# Altium footprint library PcbLib.PcbLib: 428 footprints (part 14 of 27)
Each footprint in its own frame and in the unit in brackets; x right, y up, seen from the top. Pads: shape width x height; smd on the part's side, far side on the other; paste and mask are expansions set on the pad; w line width, h text height; cw(c..) or ccw(c..) is an arc to the next point about the centre after c.
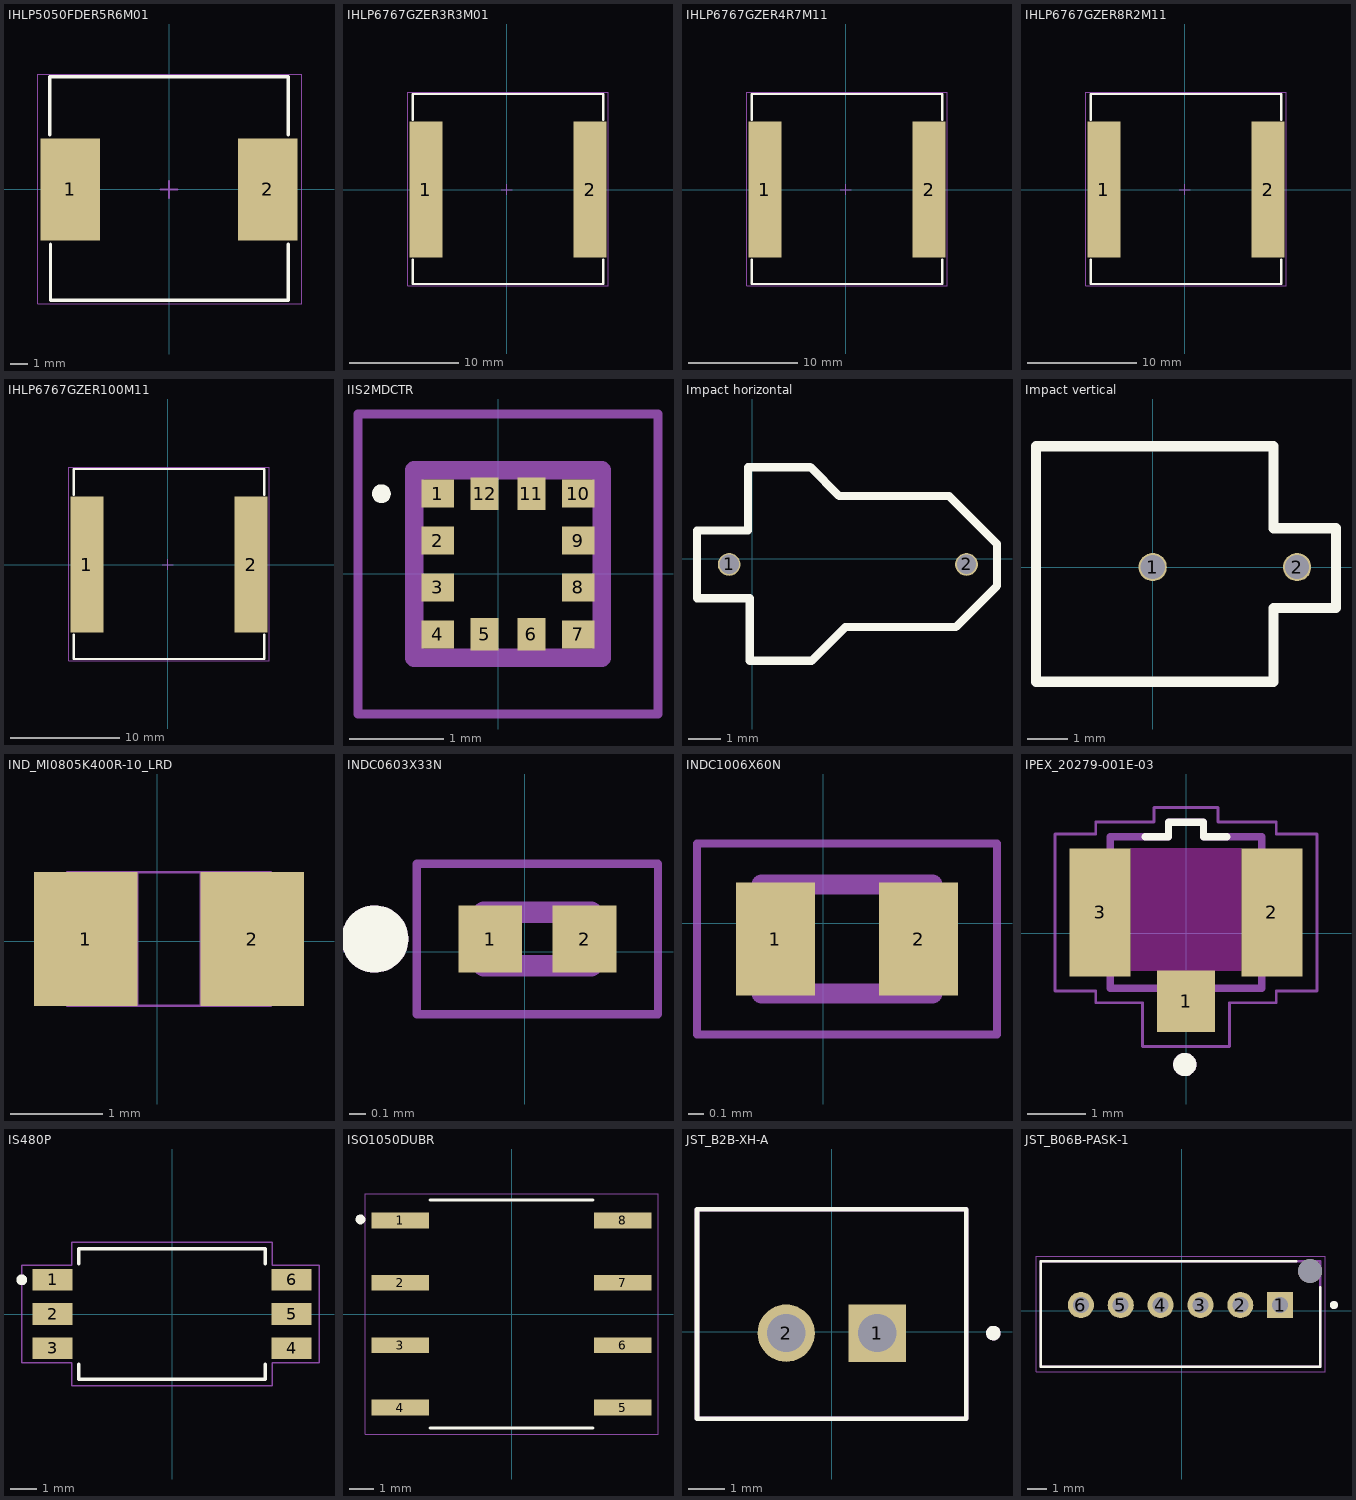
[diagram p13: the footprints below, top view; thin cyan lines are the x and y axes]

## IHLP5050FDER5R6M01 [mm] "Precision Wire Wound Inductor, 2-Leads, Body 10.80x10.16mm, IPC Medium Density"
height 4
pads (2):
  rect 3.5x6 smd: 1(-5.8,0) 2(5.8,0)
Top Overlay:
  lines w0.2: -7,3.2 -7,6.6 7,6.6 7,3.2 ; -6.95,-3.2 -6.95,-6.5 7,-6.5 7,-3.2
Mechanical 15:
  lines w0.05: -7.7,-6.7 -7.7,6.75 7.8,6.75 7.8,-6.7 -7.7,-6.7
  lines w0.1: -0.5,0 0.5,0 ; 0,-0.5 0,0.5
3D body "IND_IHLP_5050_FD_VIS.step": height 6.55, standoff 0, extent -6.858,-6.402 6.858,6.502

## IHLP6767GZER3R3M01 [mm] "Precision Wire Wound Inductor, 2-Leads, Body 10.80x10.16mm, IPC Medium Density"
height 4
pads (2):
  rect 3x12.45 smd: 1(-7.4,0) 2(7.65,0)
Top Overlay:
  lines w0.2: -8.6,-6.4 -8.6,-8.65 8.85,-8.65 8.85,-6.4 ; -8.6,6.4 -8.6,8.75 8.85,8.75 8.85,6.4
Mechanical 15:
  lines w0.05: -9.05,-8.8 -9.05,8.9 9.3,8.9 9.3,-8.8 -9.05,-8.8
  lines w0.1: -0.5,0 0.5,0 ; 0,-0.5 0,0.5
3D body "IHLP6767GZ.step": height 7.29, standoff 0.4, extent -8.456,-8.532 8.72,8.643

## IHLP6767GZER4R7M11 [mm] "Precision Wire Wound Inductor, 2-Leads, Body 10.80x10.16mm, IPC Medium Density"
height 4
pads (2):
  rect 3x12.45 smd: 1(-7.4,0) 2(7.65,0)
Top Overlay:
  lines w0.2: -8.6,-6.4 -8.6,-8.65 8.85,-8.65 8.85,-6.4 ; -8.6,6.4 -8.6,8.75 8.85,8.75 8.85,6.4
Mechanical 15:
  lines w0.05: -9.05,-8.8 -9.05,8.9 9.3,8.9 9.3,-8.8 -9.05,-8.8
  lines w0.1: -0.5,0 0.5,0 ; 0,-0.5 0,0.5
3D body "IHLP6767GZ.step": height 7.09, standoff 0.2, extent -8.454,-8.562 8.721,8.614

## IHLP6767GZER8R2M11 [mm] "Precision Wire Wound Inductor, 2-Leads, Body 10.80x10.16mm, IPC Medium Density"
height 4
pads (2):
  rect 3x12.45 smd: 1(-7.4,0) 2(7.65,0)
Top Overlay:
  lines w0.2: -8.6,-6.4 -8.6,-8.65 8.85,-8.65 8.85,-6.4 ; -8.6,6.4 -8.6,8.75 8.85,8.75 8.85,6.4
Mechanical 15:
  lines w0.05: -9.05,-8.8 -9.05,8.9 9.3,8.9 9.3,-8.8 -9.05,-8.8
  lines w0.1: -0.5,0 0.5,0 ; 0,-0.5 0,0.5
3D body "IHLP6767GZ.step": height 7.09, standoff 0.2, extent -8.45,-8.538 8.725,8.638

## IHLP6767GZER100M11 [mm] "Precision Wire Wound Inductor, 2-Leads, Body 10.80x10.16mm, IPC Medium Density"
height 4
pads (2):
  rect 3x12.45 smd: 1(-7.4,0) 2(7.65,0)
Top Overlay:
  lines w0.2: -8.6,-6.4 -8.6,-8.65 8.85,-8.65 8.85,-6.4 ; -8.6,6.4 -8.6,8.75 8.85,8.75 8.85,6.4
Mechanical 15:
  lines w0.05: -9.05,-8.8 9.3,-8.8 9.3,8.9 -9.05,8.9 -9.05,-8.8
  lines w0.1: -0.5,0 0.5,0 ; 0,-0.5 0,0.5
3D body "IHLP6767GZ.step": height 6.99, standoff 0.1, extent -8.471,-8.564 8.704,8.612

## IIS2MDCTR [mm]
pads (12):
  rect 0.35x0.3 smd: 1(-0.648,0.852) 2(-0.648,0.352) 3(-0.648,-0.148) 4(-0.648,-0.648) 7(0.852,-0.648) 8(0.852,-0.148) 9(0.852,0.352) 10(0.852,0.852)
  rect 0.3x0.35 smd: 5(-0.148,-0.648) 6(0.352,-0.648) 11(0.352,0.852) 12(-0.148,0.852)
Top Overlay:
  lines w0.1: -1.298,0.852 ccw(c-1.248,0.852) -1.198,0.852 ccw(c-1.248,0.852) -1.298,0.852
Mechanical 13:
  lines w0.1: -1.498,-1.498 -1.498,1.702 1.702,1.702 1.702,-1.498 -1.498,-1.498
  lines w0.2: -0.898,-0.898 -0.898,1.102 1.102,1.102 1.102,-0.898 -0.898,-0.898
3D body "step_temp.STEP": height 0.7, standoff 0, extent -0.898,-0.898 1.102,1.102

## Impact horizontal [mm]
pads (2):
  round 0.7 / inner round 1.524 / far side round 1.524 hole 0.6: 1(-0.711,-0.178) 2(6.604,-0.178)
Top Overlay:
  lines w0.254: -1.702,-1.219 -1.702,0.864 -0.127,0.864 -0.127,2.819 1.791,2.819 2.68,1.93 4.737,1.93 6.071,1.93 7.544,0.457 7.544,-0.838 6.274,-2.108 4.597,-2.108 2.87,-2.108 1.829,-3.15 -0.076,-3.15 -0.076,-1.219 -1.702,-1.219
3D body: height 4.8, standoff 1.2, extent 2.289,-1.88 5.889,1.72
3D body: height 5.3, standoff 0.7, extent 0.673,-2.388 2.273,2.212
3D body: height 5.75, standoff 0.25, extent 0.178,-2.859 0.678,2.641
3D body: height 3, standoff -1, extent -0.911,-0.378 -0.511,0.022
3D body: height 3.2, standoff 2.8, extent -0.85,-0.375 6.65,0.025
3D body: height 3, standoff -1, extent 6.404,-0.378 6.804,0.022

## Impact vertical [mm]
pads (2):
  round 0.7 / inner round 1.524 / far side round 1.524 hole 0.6: 1(0,0) 2(3.581,0)
Top Overlay:
  lines w0.254: -2.896,-2.845 2.997,-2.845 2.997,-1.016 4.547,-1.016 4.547,0.965 2.997,0.965 2.997,2.997 -2.896,2.997 -2.896,-2.845
3D body: height 6, standoff -1, extent 3.41,-0.2 3.81,0.2
3D body: height 6.4, standoff 5, extent -0.203,-0.197 0.197,0.203
3D body: height 6.4, standoff 6, extent 0,-0.197 3.8,0.203
3D body: height 0.5, standoff 0, extent -2.737,-2.699 2.763,2.801
3D body: height 2, standoff 0.4, extent -2.3,-2.249 2.3,2.351
3D body: height 5.6, standoff 2, extent -1.8,-1.749 1.8,1.851
3D body: height 0.5, standoff -0.5, extent -0.197,-0.197 0.203,0.203

## IND_MI0805K400R-10_LRD [mil]
pads (2):
  rect 44x57 smd paste+0 mask+0: 1(-30.5,1) 2(40.5,1)
Mechanical 13:
  lines w1: -38.5,-27.5 -38.5,29.5 ; -38.5,-27.5 -8.5,-27.5 -8.5,29.5 -38.5,29.5 ; -38.5,-27.5 48.5,-27.5 ; -38.5,-27.5 -38.5,29.5 ; -38.5,29.5 48.5,29.5 ; 48.5,-27.5 18.5,-27.5 18.5,29.5 48.5,29.5 ; 48.5,-27.5 48.5,29.5 ; 48.5,-27.5 48.5,29.5
3D body "IND_MI0805K400R-10_LRD.step": height 42.99, standoff 0, extent -38.5,-27.5 48.5,29.5

## INDC0603X33N [mm]
pads (2):
  rect 0.38x0.4 smd: 1(-0.205,0.076) 2(0.357,0.076)
Top Overlay:
  circle w0.2: c-0.892,0.076 r0.1
Mechanical 13:
  circle w0.2: c-0.892,0.076 r0.1
  lines w0.127: -0.244,-0.084 -0.244,0.236 0.396,0.236 0.396,-0.084 -0.244,-0.084
Mechanical 15:
  lines w0.05: -0.642,-0.372 -0.642,0.524 0.794,0.524 0.794,-0.372 -0.642,-0.372

## INDC1006X60N [mm]
pads (2):
  rect 0.51x0.73 smd: 1(-0.308,-0.102) 2(0.612,-0.102)
Mechanical 13:
  lines w0.127: -0.398,-0.452 0.702,-0.452 0.702,0.248 -0.398,0.248 -0.398,-0.452
Mechanical 15:
  lines w0.05: -0.813,-0.717 1.117,-0.717 1.117,0.513 -0.813,0.513 -0.813,-0.717

## IPEX_20279-001E-03 [mm]
pads (3):
  rect 1x1.05 smd: 1(0,-1.169)
  rect 1.05x2.2 smd: 2(1.475,0.356) 3(-1.475,0.356)
Top Overlay:
  circle w0.2: c-0.02,-2.254 r0.1
  lines w0.127: -0.7,1.656 -0.3,1.656 -0.3,1.906 0.3,1.906 0.3,1.656 0.7,1.656
Keep-Out Layer:
  region: 0.95,-0.644 -0.95,-0.644 -0.95,1.456 0.95,1.456
Mechanical 13:
  circle w0.2: c-0.02,-2.254 r0.1
  lines w0.127: -1.5,-0.544 -1.3,-0.544 -1.3,-0.944 -0.3,-0.944 -0.3,-1.194 0.3,-1.194 0.3,-0.944 1.3,-0.944 1.3,-0.544 1.5,-0.544 1.5,1.256 1.3,1.256 1.3,1.656 0.3,1.656 0.3,1.906 -0.3,1.906 -0.3,1.656 -1.3,1.656 -1.3,1.256 -1.5,1.256 -1.5,-0.544
Mechanical 15:
  lines w0.05: -2.25,-0.994 -2.25,1.706 -1.55,1.706 -1.55,1.906 -0.55,1.906 -0.55,2.156 0.55,2.156 0.55,1.906 1.55,1.906 1.55,1.706 2.25,1.706 2.25,-0.994 1.55,-0.994 1.55,-1.194 0.75,-1.194 0.75,-1.944 -0.75,-1.944 -0.75,-1.194 -1.55,-1.194 -1.55,-0.994 -2.25,-0.994
3D body "step_temp.STEP": height 1.25, standoff 0, extent -1.5,-1.194 1.5,1.906

## IS480P [mm]
pads (6):
  rect 1.5x0.8 smd: 1(-4.441,1.27) 2(-4.441,0) 3(-4.441,-1.27) 4(4.441,-1.27) 5(4.441,0) 6(4.441,1.27)
Top Overlay:
  circle w0.2: c-5.588,1.27 r0.1
  lines w0.127: -3.47,-1.873 -3.47,-2.42 3.47,-2.42 3.47,-1.873 ; -3.47,1.873 -3.47,2.42 3.47,2.42 3.47,1.873
Mechanical 15:
  lines w0.05: -5.588,-1.82 -5.588,1.82 -3.72,1.82 -3.72,2.67 3.72,2.67 3.72,1.82 5.461,1.82 5.461,-1.82 3.72,-1.82 3.72,-2.67 -3.72,-2.67 -3.72,-1.82 -5.588,-1.82
3D body "SOIC127P970X340-6N.step": height 3.4, standoff 0, extent -4.85,-2.25 4.85,2.25

## ISO1050DUBR [mm]
pads (8):
  rect 2.34x0.64 smd: 1(-4.535,3.81) 2(-4.535,1.27) 3(-4.535,-1.27) 4(-4.535,-3.81) 5(4.535,-3.81) 6(4.535,-1.27) 7(4.535,1.27) 8(4.535,3.81)
Top Overlay:
  circle w0.2: c-6.15,3.85 r0.1
  lines w0.127: -3.31,-4.643 3.31,-4.643 ; -3.31,4.643 3.31,4.643
Mechanical 15:
  lines w0.05: -5.96,-4.892 5.96,-4.892 5.96,4.892 -5.96,4.892 -5.96,-4.892
3D body "ISO1050DUBR--3DModel-STEP-56544.STEP": height 4.85, standoff 0, extent -5.2,-4.643 5.2,4.643

## JST_B2B-XH-A [mm]
pads (2):
  rect 1.575x1.575 / inner round 1.575 / far side rect 1.575x1.575 hole 1.05: 1(1.25,-0.042)
  round 1.575 hole 1.05: 2(-1.25,-0.042)
Top Overlay:
  circle w0.2: c4.44,-0.042 r0.1
  lines w0.127: -3.7,-2.392 3.7,-2.392 3.7,3.358 -3.7,3.358 -3.7,-2.392
Mechanical 13:
  circle w0.2: c4.44,-0.042 r0.1
  lines w0.127: -3.7,-2.392 3.7,-2.392 3.7,3.358 -3.7,3.358 -3.7,-2.392
3D body "B2B-XH-A--3DModel-STEP-56544.STEP": height 7, standoff -3.4, extent -3.661,-2.369 3.739,3.381

## JST_B06B-PASK-1 [mm] "Connector Header Through Hole 6 position 2mm Pitch"
pads (7):
  rect 1.308x1.308 / inner round 1.308 / far side rect 1.308x1.308 hole 0.8: 1(4.947,0.277)
  round 1.308 hole 0.8: 2(2.947,0.277) 3(0.947,0.277) 4(-1.053,0.277) 5(-3.053,0.277) 6(-5.053,0.277)
  round 1.2 hole 1.2 unplated: ""(6.447,1.977)
Top Overlay:
  circle w0.2: c7.647,0.277 r0.1
  lines w0.127: 5.747,2.477 -7.053,2.477 -7.053,-2.823 6.947,-2.823 6.947,1.177
Mechanical 13:
  circle w0.2: c7.647,0.277 r0.1
  lines w0.127: -7.053,-2.823 -7.053,2.477 6.947,2.477 6.947,-2.823 -7.053,-2.823
Mechanical 15:
  lines w0.05: -7.303,-3.073 -7.303,2.727 7.197,2.727 7.197,-3.073 -7.303,-3.073
3D body "step_temp.STEP": height 7.7, standoff -3, extent -7.006,-2.773 6.994,2.527